# Altium footprint library CONNECTOR.PcbLib: 169 footprints (part 7 of 11)
Each footprint in its own frame and in the unit in brackets; x right, y up, seen from the top. Pads: shape width x height; smd on the part's side, far side on the other; paste and mask are expansions set on the pad; w line width, h text height; cw(c..) or ccw(c..) is an arc to the next point about the centre after c.
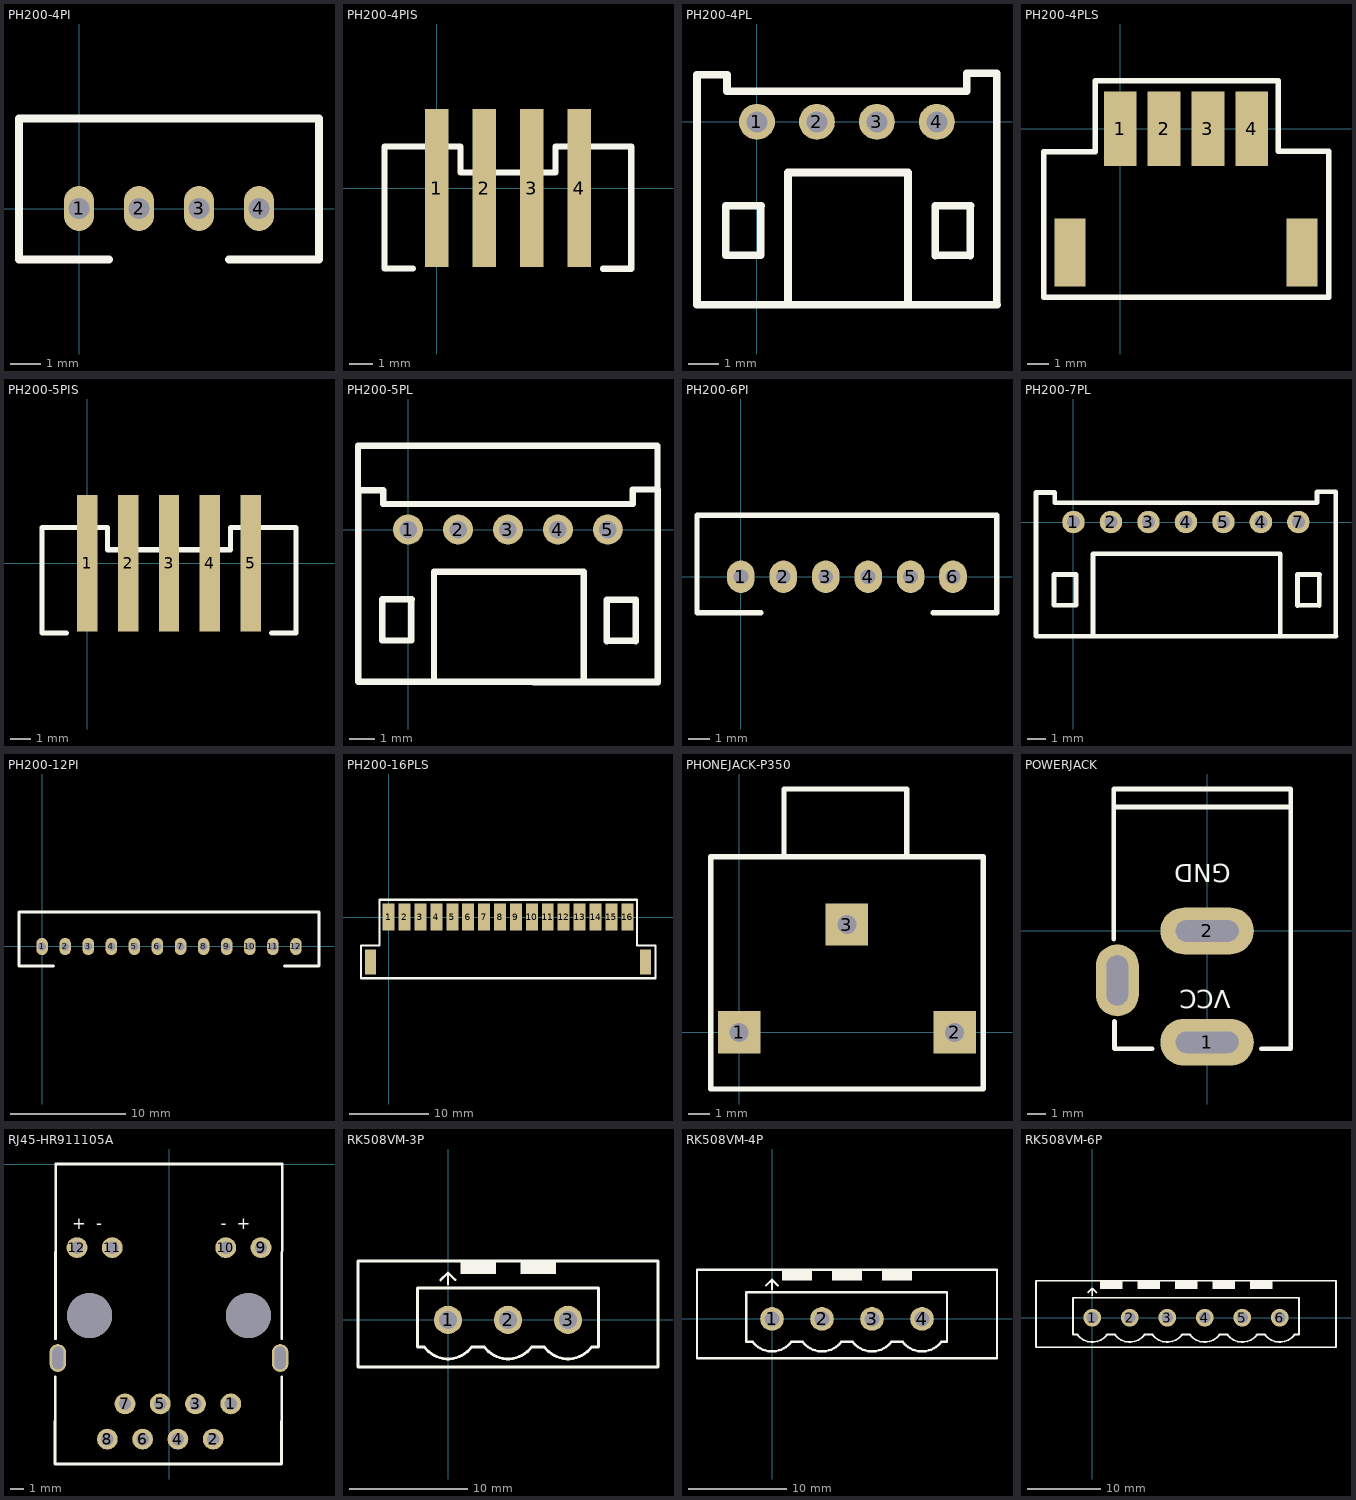
[diagram p6: the footprints below, top view; thin cyan lines are the x and y axes]

## PH200-4PI [mm]
pads (4):
  oval 1x1.5 hole 0.7: 1(0,0) 2(2,0) 3(4,0) 4(6,0)
Top Overlay:
  lines w0.254: 1,-1.7 -2,-1.7 -2,3 8,3 8,-1.7 5,-1.7
3D body "User Library-b4b-ph-k-s.STEP": height 6, standoff -3, extent -1.996,-1.779 7.904,2.721

## PH200-4PIS [mm]
pads (4):
  rect 1x6.65 smd: 1(0,0) 2(2,0) 3(4,0) 4(6,0)
Top Overlay:
  lines w0.254: -2.2,-3.4 -1,-3.4 ; -2.2,-3.4 -2.2,1.75 1,1.75 1,0.663 5,0.663 5,1.744 8.197,1.744 8.197,-3.402 6.998,-3.402

## PH200-4PL [mm]
height 5
pads (4):
  round 1.2 hole 0.7: 1(0,0) 2(2,0) 3(4,0) 4(6,0)
Top Overlay:
  lines w0.254: -1.981,-6.097 7.98,-6.097 ; -1,1.563 -1,1.025 7,1.025 7,1.619 8,1.619 ; -1,1.57 -2,1.57 -2,0 -2,-6.1 1.036,-6.1 1.036,-1.69 5.038,-1.69 5.038,-6.1 8.008,-6.1 ; 0.128,-2.82 0.128,-4.447 -1.035,-4.447 -1.035,-2.794 0.141,-2.794 ; 5.951,-4.466 5.951,-2.813 ; 5.951,-4.447 7.114,-4.447 ; 5.951,-2.794 7.127,-2.794 ; 7.114,-4.466 7.114,-2.839 ; 8,-6.1 8,0 8,1.57

## PH200-4PLS [mm]
pads (6):
  rect 1.5x3.4 smd: 1(0,0) 2(2,0) 3(4,0) 4(6,0)
  rect 1.4x3.1 smd: ""(-2.3,-5.65) ""(8.3,-5.65)
Top Overlay:
  lines w0.254: -3.492,-7.691 9.522,-7.691 9.522,-1.034 7.216,-1.034 7.216,2.177 -1.141,2.177 -1.141,-1.059 -3.492,-1.059 -3.492,-7.691
3D body "1734827-4.stp": height 5.75, standoff 0.15, extent -2.961,-7.165 9.039,1.435

## PH200-5PIS [mm]
pads (5):
  rect 1x6.65 smd: 1(0,0) 2(2,0) 3(4,0) 4(6,0) 5(8,0)
Top Overlay:
  lines w0.254: -1,-3.4 -2.2,-3.4 -2.2,1.75 1,1.75 1,0.663 7,0.663 7,1.75 ; 7,1.75 10.2,1.75 10.2,-3.4 9,-3.4

## PH200-5PL [mm]
pads (5):
  round 1.2 hole 0.7: 1(0,0) 2(2,0) 3(4,0) 4(6,0) 5(8,0)
Top Overlay:
  lines w0.254: -2.006,1.542 -2.006,3.353 9.977,3.353 9.992,3.338 9.992,1.515 ; -1.981,-6.097 7.98,-6.097 ; -1,1.563 -1,1.025 9.001,1.025 9.001,1.605 10.001,1.605 ; -1,1.57 -2,1.57 -2,0 -2,-6.1 1.036,-6.1 1.036,-1.69 7.033,-1.69 ; 0.128,-2.82 0.128,-4.447 -1.035,-4.447 -1.035,-2.794 0.141,-2.794 ; 5.039,-6.114 8.009,-6.114 ; 7.038,-6.1 10.008,-6.1 ; 7.039,-1.704 7.039,-6.114 10.009,-6.114 ; 7.952,-4.48 7.952,-2.827 ; 7.952,-4.461 9.115,-4.461 ; 7.952,-2.808 9.128,-2.808 ; 9.115,-4.48 9.115,-2.853 ; 10.001,-6.114 10.001,-0.014 10.001,1.556

## PH200-6PI [mm]
height 6
pads (6):
  oval 1.3x1.524 hole 0.7: 1(0,0) 2(2,0) 3(4,0) 4(6,0) 5(8,0) 6(10,0)
Top Overlay:
  lines w0.254: 0.93,-1.7 -2.07,-1.7 -2.07,2.9 12.075,2.9 ; 9.07,-1.7 12.07,-1.7 12.07,2.9
3D body: height 6, standoff 0, extent -2.2,-1.83 12.2,3.03
3D body: height 1.6, standoff 0, extent -1.94,-1.57 11.94,2.77
3D body: height 3.4, standoff 0, extent -0.23,-0.26 0.23,0.26
3D body: height 5, standoff 0, extent -0.23,-0.26 0.23,0.26
3D body: height 3.46, standoff 0, extent 1.77,-0.26 2.23,0.26
3D body: height 5, standoff 0, extent 1.77,-0.26 2.23,0.26
3D body: height 3.4, standoff 0, extent 3.77,-0.26 4.23,0.26
3D body: height 5, standoff 0, extent 3.77,-0.26 4.23,0.26
3D body: height 3.4, standoff 0, extent 5.77,-0.26 6.23,0.26
3D body: height 5, standoff 0, extent 5.77,-0.26 6.23,0.26
3D body: height 3.4, standoff 0, extent 7.77,-0.26 8.23,0.26
3D body: height 5, standoff 0, extent 7.77,-0.26 8.23,0.26
3D body: height 3.6, standoff 0, extent 9.77,-0.26 10.23,0.26
3D body: height 5, standoff 0, extent 9.77,-0.26 10.23,0.26

## PH200-7PL [mm]
pads (7):
  round 1.2 hole 0.7: 1(0,0) 2(2,0) 3(4,0) 4(6,0) 4(10,0) 5(8,0) 7(12,0)
Top Overlay:
  lines w0.254: -1.981,-6.097 7.98,-6.097 ; -1,1.563 -1,1.025 13,1.025 13,1.619 14,1.619 ; -1,1.57 -2,1.57 -2,0 -2,-6.1 1.036,-6.1 1.036,-1.69 11.038,-1.69 11.038,-6.1 14.008,-6.1 ; 0.128,-2.82 0.128,-4.447 -1.035,-4.447 -1.035,-2.794 0.141,-2.794 ; 5.038,-6.1 8.008,-6.1 ; 7.038,-6.1 10.008,-6.1 ; 9.038,-6.1 12.008,-6.1 ; 11.951,-4.466 11.951,-2.813 ; 11.951,-4.447 13.114,-4.447 ; 11.951,-2.794 13.127,-2.794 ; 13.114,-4.466 13.114,-2.839 ; 14,-6.1 14,0 14,1.57

## PH200-12PI [mm]
pads (12):
  oval 1x1.5 hole 0.7: 1(0,0) 2(2,0) 3(4,0) 4(6,0) 5(8,0) 6(10,0) 7(12,0) 8(14,0) 9(16,0) 10(18,0) 11(20,0) 12(22,0)
Top Overlay:
  lines w0.254: 1,-1.7 -2,-1.7 -2,3 24,3 24,-1.7 21,-1.7

## PH200-16PLS [mm]
pads (18):
  rect 1.5x3.4 smd: 1(0,0) 2(2,0) 3(4,0) 4(6,0) 5(8,0) 6(10,0) 7(12,0) 8(14,0) 9(16,0) 10(18,0) 11(20,0) 12(22,0) 13(24,0) 14(26,0) 15(28,0) 16(30,0)
  rect 1.4x3.1 smd: ""(-2.3,-5.65) ""(32.303,-5.65)
Top Overlay:
  lines w0.254: 33.525,-7.692 -3.492,-7.692 -3.492,-3.576 -1.141,-3.576 -1.141,2.176 31.219,2.176 31.219,-3.577 33.525,-3.577 33.525,-7.69

## PHONEJACK-P350 [mm]
pads (3):
  rect 2x2 hole 0.9: 1(0,0) 2(10.16,0) 3(5.08,5.08)
Top Overlay:
  lines w0.25: 2.115,8.282 2.115,11.469 ; 7.904,8.291 7.904,11.469 ; -1.333,-2.672 11.505,-2.672 11.505,8.271 -1.333,8.271 -1.333,-2.672
  lines w0.254: 2.115,11.469 7.904,11.469
3D body "SW3dPS-CONNECTOR, PHONE JACK, STEREO, 3.5 MM, SEE-PLUS ST-3536-02HG.STEP": height 10.51, standoff -2.99, extent -0.917,-2.525 11.083,11.575

## POWERJACK [mm]
pads (3):
  oval 5.2x2.6 hole 1.2 slot 3.5 at 0 deg: 1(-0.002,-6.2) 2(0,0)
  oval 2.4x4 hole 1.2 slot 2.8 at 90 deg: ""(-5.002,-2.75)
Top Overlay:
  lines w0.254: -5.209,-0.475 -5.209,7.901 4.646,7.901 4.646,-6.552 3.023,-6.552 ; -5.209,6.901 4.62,6.901 ; -5.159,-5.028 -5.159,-6.552 -3.05,-6.552
  text "VCC" at 1.323,-3.3 h1
  text "GND" at 1.323,3.7 h1
3D body "User Library-K375A -PCM DC Power Jack 2mm Pin.STEP": height 11, standoff -5.1, extent -5.156,-6.552 4.644,7.948

## RJ45-HR911105A [mm]
pads (16):
  round 1.5 hole 0.89 mask+0.102: 1(4.45,-17.27) 2(3.18,-19.81) 3(1.91,-17.27) 4(0.64,-19.81) 5(-0.63,-17.27) 6(-1.9,-19.81) 7(-3.17,-17.27) 8(-4.44,-19.81) 9(6.625,-6.02) 10(4.085,-6.02) 11(-4.085,-6.02) 12(-6.625,-6.02)
  oval 1.2x2 hole 0.8 slot 1.63 at 90 deg mask+0.102: ""(-8,-13.97) ""(8,-13.97)
  round 3.25 hole 3.25 mask+0.102: ""(-5.715,-10.92) ""(5.715,-10.92)
Top Overlay:
  lines w0.2: -8.186,-15.318 -8.201,-21.6 8.099,-21.6 8.114,-15.318 ; -8.18,-12.581 -8.15,0 8.15,0 8.12,-12.581
  text "+  -" at -6.975,-4.977 h1.5
  text "-  +" at 3.735,-4.977 h1.5

## RK508VM-3P [mm]
height 12
pads (3):
  round 2.4 hole 1.5: 1(0,0) 2(5.08,0) 3(10.16,0)
Top Overlay:
  rectangle: 1.04,3.9 4.08,4.9
  rectangle: 6.12,3.9 9.16,4.9
  lines w0.2: -0.63,3.37 0,4 ; 0,3 0,4 ; 0.61,3.39 0,4
  lines w0.25: 1.997,-2.297 cw(c-0.002,-0.797) -2,-2.3 -2.6,-2.3 -2.6,2.7 12.76,2.7 12.76,-2.3 ; 2,-2.3 3.08,-2.3 ccw(c5.078,-0.797) 7.077,-2.297 ; 7.08,-2.3 8.16,-2.3 ccw(c10.158,-0.797) 12.157,-2.297 ; 12.76,-2.3 12.16,-2.3 12.76,-2.3 ; -7.62,-4 -7.62,5 17.78,5 17.78,-4 -7.62,-4

## RK508VM-4P [mm]
height 12
pads (4):
  round 2.4 hole 1.5: 1(0,0) 2(5.08,0) 3(10.16,0) 4(15.24,0)
Top Overlay:
  rectangle: 11.2,3.901 14.24,4.901
  rectangle: 6.12,3.901 9.16,4.901
  rectangle: 1.04,3.901 4.08,4.901
  lines w0.2: -0.63,3.37 0,4 ; 0,3 0,4 ; 0.61,3.39 0,4
  lines w0.25: 1.997,-2.297 cw(c-0.002,-0.797) -2,-2.3 -2.6,-2.3 -2.6,2.7 17.78,2.7 17.78,-2.3 17.24,-2.3 ; 2,-2.3 3.08,-2.3 ccw(c5.078,-0.797) 7.077,-2.297 ; 7.08,-2.3 8.16,-2.3 ccw(c10.158,-0.797) 12.157,-2.297 ; 12.16,-2.3 13.24,-2.3 ccw(c15.238,-0.797) 17.237,-2.297 ; -7.62,-4 22.86,-4 22.86,5 -7.62,5 -7.62,-4

## RK508VM-6P [mm]
height 12
pads (6):
  round 2.4 hole 1.5: 1(0,0) 2(5.08,0) 3(10.16,0) 4(15.24,0) 5(20.32,0) 6(25.4,0)
Top Overlay:
  rectangle: 1.04,3.901 4.08,4.901
  rectangle: 6.12,3.901 9.16,4.901
  rectangle: 11.2,3.901 14.24,4.901
  rectangle: 16.28,3.901 19.32,4.901
  rectangle: 21.36,3.901 24.4,4.901
  rectangle: 21.36,3.901 24.4,4.901
  lines w0.2: -0.63,3.37 0,4 ; 0,3 0,4 ; 0.61,3.39 0,4
  lines w0.25: 1.997,-2.297 cw(c-0.002,-0.797) -2,-2.3 -2.6,-2.3 -2.6,2.7 28,2.7 28,-2.3 ; 2,-2.3 3.08,-2.3 ccw(c5.078,-0.797) 7.077,-2.297 ; 7.08,-2.3 8.16,-2.3 ccw(c10.158,-0.797) 12.157,-2.297 ; 12.16,-2.3 13.24,-2.3 ccw(c15.238,-0.797) 17.237,-2.297 ; 17.24,-2.3 18.32,-2.3 ccw(c20.318,-0.797) 22.317,-2.297 ; 23.4,-2.3 ccw(c25.398,-0.797) 27.397,-2.297 cw(c25.398,-0.797) 23.4,-2.3 ; 23.4,-2.3 22.32,-2.3 23.4,-2.3 ; 28,-2.3 27.4,-2.3 28,-2.3 ; -7.62,-4 -7.62,5 33.02,5 33.02,-4 -7.62,-4